# Altium footprint library PRL_PDC.PcbLib: 77 footprints (part 5 of 5)
Each footprint in its own frame and in the unit in brackets; x right, y up, seen from the top. Pads: shape width x height; smd on the part's side, far side on the other; paste and mask are expansions set on the pad; w line width, h text height; cw(c..) or ccw(c..) is an arc to the next point about the centre after c.
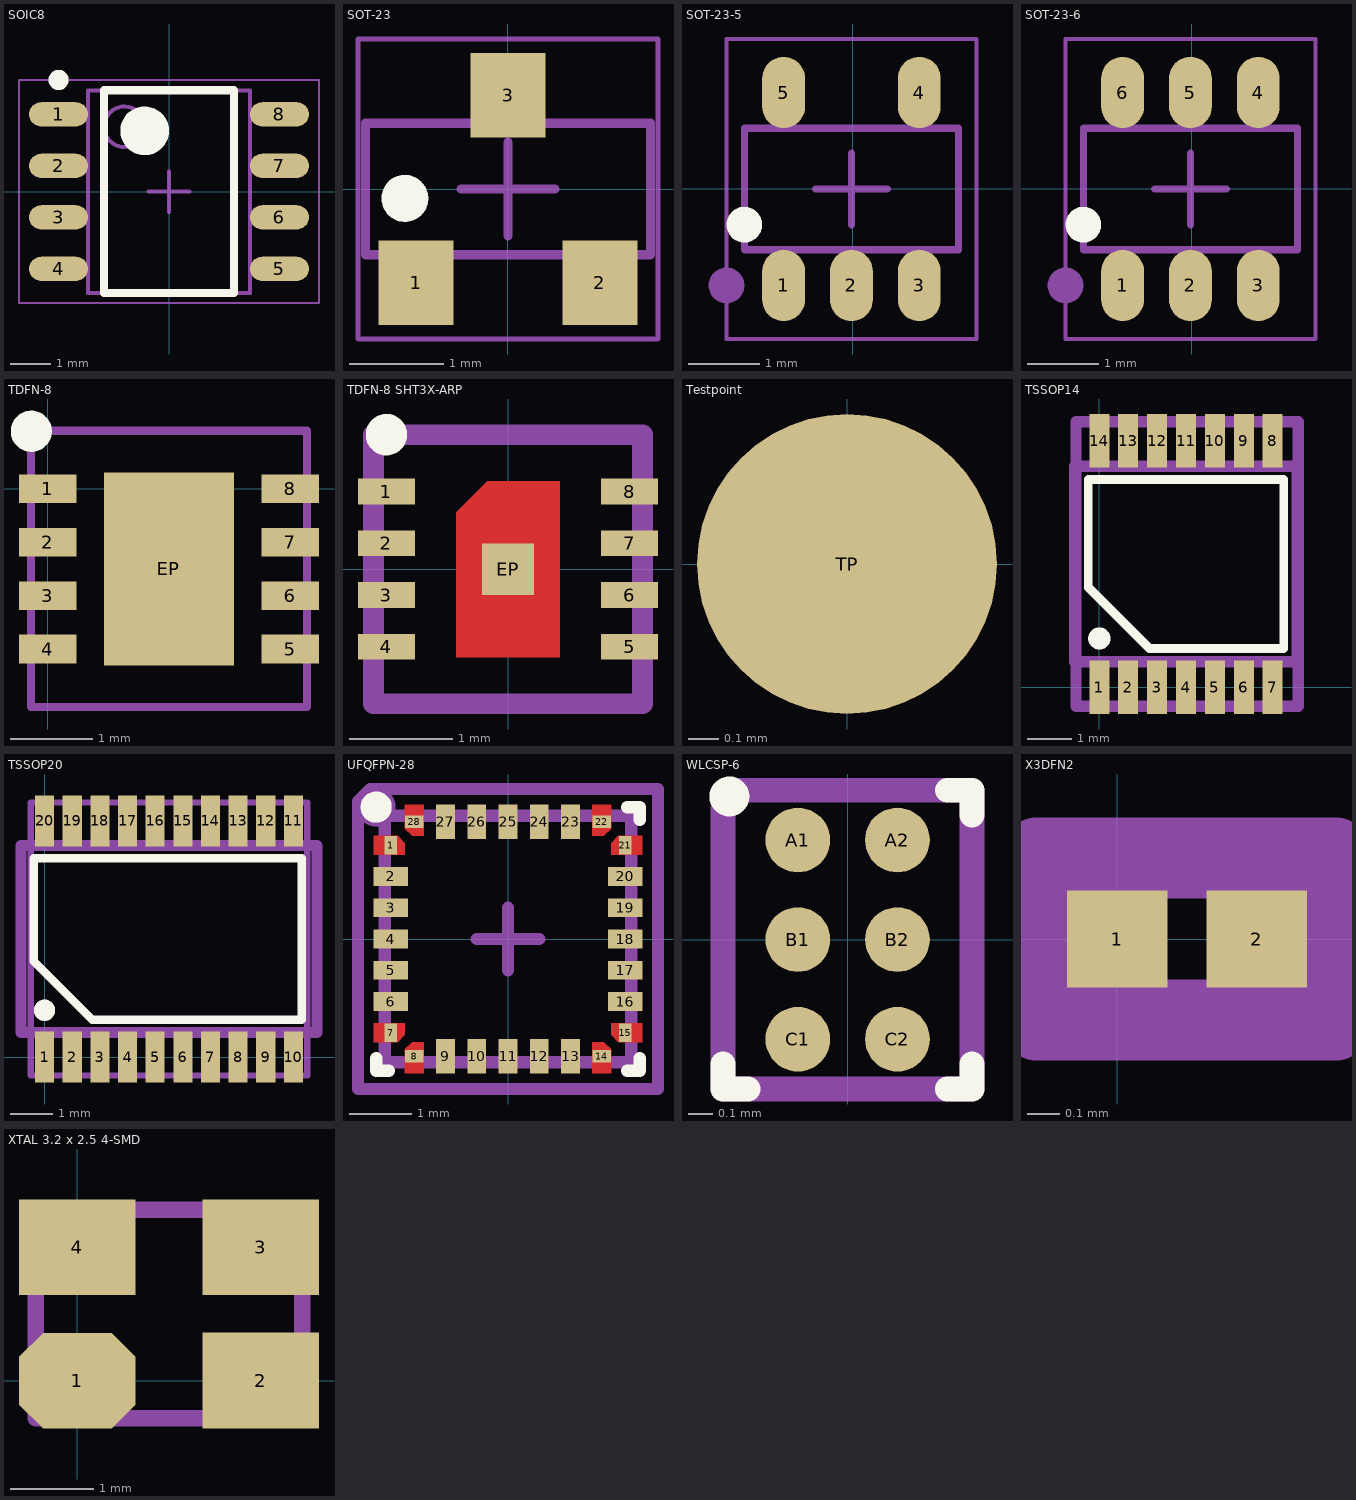
[diagram p4: the footprints below, top view; thin cyan lines are the x and y axes]

## SOIC8 [mm] "SOIC, 8-Leads, Body 4,90x3,90mm, Pitch 1,27mm, IPC Medium Density"
height 1.75
pads (8):
  oval 1.45x0.6 smd: 1(-2.725,1.905) 2(-2.725,0.635) 3(-2.725,-0.635) 4(-2.725,-1.905) 5(2.725,-1.905) 6(2.725,-0.635) 7(2.725,0.635) 8(2.725,1.905)
Top Overlay:
  circle w0.25: c-2.725,2.755 r0.125
  circle w0.6: c-0.6,1.5 r0.3
  lines w0.2: -1.6,-2.5 -1.6,2.5 1.6,2.5 1.6,-2.5 -1.6,-2.5
Mechanical 13:
  circle w0.1: c-1.1,1.6 r0.5
  lines w0.1: -2,-2.5 -2,2.5 2,2.5 2,-2.5 -2,-2.5
Mechanical 15:
  lines w0.05: -3.7,-2.75 -3.7,2.75 3.7,2.75 3.7,-2.75 -3.7,-2.75
  lines w0.1: -0.5,0 0.5,0 ; 0,-0.5 0,0.5
3D body "SOIC127P600X175-8N.step": height 1.75, standoff 0, extent -3,-2.5 3,2.5

## SOT-23 [mm]
height 1.1
pads (3):
  rect 0.8x0.9 smd: 1(-0.98,-1) 2(0.98,-1) 3(0,1)
Top Overlay:
  circle w0.25: c-1.1,-0.1 r0.125
Mechanical 13:
  lines w0.1: -1.52,-0.7 -1.52,0.7 1.52,0.7 1.52,-0.7 -1.52,-0.7
Mechanical 15:
  lines w0.05: -1.6,-1.6 -1.6,1.6 1.6,1.6 1.6,-1.6 -1.6,-1.6
  lines w0.1: -0.5,0 0.5,0 ; 0,-0.5 0,0.5
3D body "User Library-sot23-1.step": height 1, standoff 0, extent -1.46,-1.17 1.46,1.17

## SOT-23-5 [mm]
height 1.1
pads (5):
  oval 0.6x1 smd: 1(-0.966,-1.35) 2(-0.016,-1.35) 3(0.934,-1.35) 4(0.934,1.35) 5(-0.966,1.35)
Top Overlay:
  circle w0.25: c-1.516,-0.5 r0.125
Mechanical 1:
  circle w0.25: c-1.766,-1.35 r0.125
Mechanical 13:
  lines w0.1: -1.516,-0.85 1.484,-0.85 1.484,0.85 -1.516,0.85 -1.516,-0.85
Mechanical 15:
  lines w0.05: -1.766,-2.1 -1.766,2.1 1.734,2.1 1.734,-2.1 -1.766,-2.1
  lines w0.1: -0.516,0 0.484,0 ; -0.016,-0.5 -0.016,0.5
3D body "User Library-SOT-23-5.STEP": height 1.5, standoff 0.04, extent -1.516,-1.5 1.484,1.5

## SOT-23-6 [mm]
height 1.1
pads (6):
  oval 0.6x1 smd: 1(-0.966,-1.35) 2(-0.016,-1.35) 3(0.934,-1.35) 4(0.934,1.35) 5(-0.016,1.35) 6(-0.966,1.35)
Top Overlay:
  circle w0.25: c-1.516,-0.5 r0.125
Mechanical 1:
  circle w0.25: c-1.766,-1.35 r0.125
Mechanical 13:
  lines w0.1: -1.516,-0.85 -1.516,0.85 1.484,0.85 1.484,-0.85 -1.516,-0.85
Mechanical 15:
  lines w0.05: -1.766,-2.1 1.734,-2.1 1.734,2.1 -1.766,2.1 -1.766,-2.1
  lines w0.1: -0.516,0 0.484,0 ; -0.016,-0.5 -0.016,0.5
3D body "TSOP95P280X145-6N.step": height 1.45, standoff 0, extent -1.516,-1.4 1.484,1.4

## TDFN-8 [mm] "TDFN-8"
height 1
pads (9):
  rect 0.7x0.35 smd paste-0.1: 1(0,0) 2(0,-0.65) 3(0,-1.3) 4(0,-1.95) 5(2.95,-1.95) 6(2.95,-1.3) 7(2.95,-0.65) 8(2.95,0)
  rect 1.58x2.35 smd paste-0.1: EP(1.475,-0.975)
Top Overlay:
  circle w0.25: c-0.2,0.7 r0.125
Mechanical 1:
  lines w0.1: -0.205,-2.655 3.155,-2.655 3.155,0.705 -0.205,0.705 -0.205,-2.655
3D body "User Library-TDFN-8-EP_3x3mm.step": height 1, standoff 0, extent -0.205,-2.655 3.155,0.705

## TDFN-8 SHT3X-ARP [mm] "TDFN-8"
height 1
pads (9):
  rect 0.55x0.25 smd paste-0.1: 1(-1.175,0.75) 2(-1.175,0.25) 3(-1.175,-0.25) 4(-1.175,-0.75) 5(1.175,-0.75) 6(1.175,-0.25) 7(1.175,0.25) 8(1.175,0.75)
  rect 0.5x0.5 smd: EP(0,0)
Top Layer:
  region: -0.2,0.85 0.5,0.85 0.5,-0.85 -0.5,-0.85 -0.5,0.55
Top Overlay:
  circle w0.2: c-1.175,1.3 r0.1
Mechanical 1:
  lines w0.1: -1.251,-1.251 1.251,-1.251 1.251,1.251 -1.251,1.251 -1.251,-1.251
Mechanical 15:
  lines w0.2: -1.3,-1.3 1.3,-1.3 1.3,1.3 -1.3,1.3 -1.3,-1.3
3D body "Sensirion_Humidity_SHT3x_STEP-file.STEP": height 0.95, standoff 0.05, extent -1.251,-1.251 1.251,1.251

## Testpoint [mm]
pads (1):
  round 1 smd paste-0.1: TP(0,0)

## TSSOP14 [mm] "14-Lead Plastic TSSOP (4.4mm)"
height 2
pads (14):
  rect 0.45x1.2 smd: 1(0,0) 2(0.65,0) 3(1.3,0) 4(1.95,0) 5(2.6,0) 6(3.25,0) 7(3.9,0) 8(3.9,5.55) 9(3.25,5.55) 10(2.6,5.55) 11(1.95,5.55) 12(1.3,5.55) 13(0.65,5.55) 14(0,5.55)
Top Overlay:
  circle w0.3: c0,1.1 r0.1
  lines w0.2: -0.25,2.25 1.125,0.875 4.15,0.875 4.15,4.675 -0.25,4.675 -0.25,2.25
Mechanical 1:
  lines w0.254: -0.527,5.9 -0.451,5.976 4.473,5.976 4.473,-0.426 -0.527,-0.426 -0.527,5.976
Mechanical 15:
  lines w0.1: -0.15,0.575 -0.15,-0.425 0.15,-0.425 0.15,0.575 ; -0.15,4.975 -0.15,5.975 0.15,5.975 0.15,4.975 ; 0.5,0.575 0.5,-0.425 0.8,-0.425 0.8,0.575 ; 0.5,4.975 0.5,5.975 0.8,5.975 0.8,4.975 ; 1.15,0.575 1.15,-0.425 1.45,-0.425 1.45,0.575 ; 1.15,4.975 1.15,5.975 1.45,5.975 1.45,4.975 ; 1.8,0.575 1.8,-0.425 2.1,-0.425 2.1,0.575 ; 1.8,4.975 1.8,5.975 2.1,5.975 2.1,4.975 ; 2.45,0.575 2.45,-0.425 2.75,-0.425 2.75,0.575 ; 2.45,4.975 2.45,5.975 2.75,5.975 2.75,4.975 ; 3.1,0.575 3.1,-0.425 3.4,-0.425 3.4,0.575 ; 3.1,4.975 3.1,5.975 3.4,5.975 3.4,4.975 ; 3.75,0.575 3.75,-0.425 4.05,-0.425 4.05,0.575 ; 3.75,4.975 3.75,5.975 4.05,5.975 4.05,4.975
  lines w0.254: -0.55,0.575 -0.55,4.975 4.45,4.975 4.45,0.575 -0.55,0.575
3D body "tssop_14.step": height 1.26, standoff 0.04, extent -0.489,-0.426 4.511,5.976

## TSSOP20 [mm] "20-Lead Plastic TSSOP (6.5mm)"
height 2
pads (20):
  rect 0.45x1.2 smd: 1(0,0) 2(0.65,0) 3(1.3,0) 4(1.95,0) 5(2.6,0) 6(3.25,0) 7(3.9,0) 8(4.55,0) 9(5.2,0) 10(5.85,0) 11(5.85,5.55) 12(5.2,5.55) 13(4.55,5.55) 14(3.9,5.55) 15(3.25,5.55) 16(2.6,5.55) 17(1.95,5.55) 18(1.3,5.55) 19(0.65,5.55) 20(0,5.55)
Top Overlay:
  circle w0.3: c0,1.1 r0.1
  lines w0.2: -0.25,2.25 1.125,0.875 6.05,0.875 6.05,4.675 -0.25,4.675 -0.25,2.25
Mechanical 1:
  lines w0.15: -0.325,-0.433 -0.325,5.983 6.175,5.983 6.175,-0.433 -0.325,-0.433
Mechanical 15:
  circle w0.3: c0,1.1 r0.1
  lines w0.1: -0.15,0.575 -0.15,-0.425 0.15,-0.425 0.15,0.575 ; -0.15,4.975 -0.15,5.975 0.15,5.975 0.15,4.975 ; 0.5,0.575 0.5,-0.425 0.8,-0.425 0.8,0.575 ; 0.5,4.975 0.5,5.975 0.8,5.975 0.8,4.975 ; 1.15,0.575 1.15,-0.425 1.45,-0.425 1.45,0.575 ; 1.15,4.975 1.15,5.975 1.45,5.975 1.45,4.975 ; 1.8,0.575 1.8,-0.425 2.1,-0.425 2.1,0.575 ; 1.8,4.975 1.8,5.975 2.1,5.975 2.1,4.975 ; 2.45,0.575 2.45,-0.425 2.75,-0.425 2.75,0.575 ; 2.45,4.975 2.45,5.975 2.75,5.975 2.75,4.975 ; 3.1,0.575 3.1,-0.425 3.4,-0.425 3.4,0.575 ; 3.1,4.975 3.1,5.975 3.4,5.975 3.4,4.975 ; 3.75,0.575 3.75,-0.425 4.05,-0.425 4.05,0.575 ; 4.4,0.575 4.4,-0.425 4.7,-0.425 4.7,0.575 ; 4.4,4.975 4.4,5.975 4.7,5.975 4.7,4.975 ; 5.05,0.575 5.05,-0.425 5.35,-0.425 5.35,0.575 ; 5.05,4.975 5.05,5.975 5.35,5.975 5.35,4.975 ; 5.7,0.575 5.7,-0.425 6,-0.425 6,0.575 ; 5.7,4.975 5.7,5.975 6,5.975 6,4.975 ; 3.75,5.975 3.75,4.975 3.75,5.975 ; 3.75,5.975 4.05,5.975 ; 3.75,5.975 4.05,5.975 ; 4.05,5.975 4.05,4.975 4.05,5.975
  lines w0.254: -0.55,0.575 -0.55,4.975 6.4,4.975 6.4,0.575 -0.55,0.575
3D body "TSSOP-20.stp": height 1.3, standoff -0.02, extent -0.325,-0.433 6.175,5.983

## UFQFPN-28 [mm] "UFQFPN-28 4X4 BODY"
height 1
pads (28):
  rect 0.2x0.3 smd paste+0 mask+0: 1(-1.875,1.5) 15(1.875,-1.5)
  rect 0.55x0.3 smd: 2(-1.875,1) 3(-1.875,0.5) 4(-1.875,0) 5(-1.875,-0.5) 6(-1.875,-1) 16(1.875,-1) 17(1.875,-0.5) 18(1.875,0) 19(1.875,0.5) 20(1.875,1)
  rect 0.2x0.3 smd mask+0: 7(-1.875,-1.5) 21(1.875,1.5)
  rect 0.3x0.2 smd paste+0 mask+0: 8(-1.5,-1.875) 22(1.5,1.875)
  rect 0.3x0.55 smd: 9(-1,-1.875) 10(-0.5,-1.875) 11(0,-1.875) 12(0.5,-1.875) 13(1,-1.875) 23(1,1.875) 24(0.5,1.875) 25(0,1.875) 26(-0.5,1.875) 27(-1,1.875)
  rect 0.3x0.2 smd mask+0: 14(1.5,-1.875) 28(-1.5,1.875)
Top Layer:
  region: -1.35,-1.65 -1.535,-1.65 -1.65,-1.765 -1.65,-2.15 -1.35,-2.15
  region: 1.35,-1.65 1.535,-1.65 1.65,-1.765 1.65,-2.15 1.35,-2.15
  region: -1.65,-1.35 -1.65,-1.535 -1.765,-1.65 -2.15,-1.65 -2.15,-1.35
  region: -1.65,1.35 -1.65,1.535 -1.765,1.65 -2.15,1.65 -2.15,1.35
  region: 1.65,-1.35 1.65,-1.535 1.765,-1.65 2.15,-1.65 2.15,-1.35
  region: 1.65,1.35 1.65,1.535 1.765,1.65 2.15,1.65 2.15,1.35
  region: -1.35,1.65 -1.535,1.65 -1.65,1.765 -1.65,2.15 -1.35,2.15
  region: 1.35,1.65 1.535,1.65 1.65,1.765 1.65,2.15 1.35,2.15
Top Overlay:
  circle w0.25: c-2.11,2.11 r0.125
  lines w0.2: -2.11,-1.91 -2.11,-2.11 -1.91,-2.11 ; 1.91,-2.11 2.11,-2.11 2.11,-1.91 ; 1.91,2.11 2.11,2.11 2.11,1.91
Mechanical 13:
  circle w0.3: c-2.11,2.11 r0.162
  lines w0.2: -1.975,-1.975 1.975,-1.975 1.975,1.975 -1.975,1.975 -1.975,-1.975
Mechanical 15:
  lines w0.2: -0.5,0 0.5,0 ; 0,-0.5 0,0.5 ; -2.4,-2.4 -2.4,2.2 -2.2,2.4 2.4,2.4 2.4,-2.4 -2.4,-2.4
3D body "UFQFPN28.step": height 0.57, standoff -0.01, extent -2.01,-2.01 2.01,2.01

## WLCSP-6 [mm] "6-Ball Wafer Level Chip Scale Package 1.00 mm × 1.20 mm Body"
height 1
pads (6):
  round 0.26 smd mask+0: A1(-0.2,0.4) A2(0.2,0.4) B1(-0.2,0) B2(0.2,0) C1(-0.2,-0.4) C2(0.2,-0.4)
Top Overlay:
  circle w0.1: c-0.475,0.575 r0.03
  lines w0.1: -0.5,-0.5 -0.5,-0.6 -0.4,-0.6 ; 0.4,-0.6 0.5,-0.6 0.5,-0.5 ; 0.4,0.6 0.5,0.6 0.5,0.5
Mechanical 1:
  lines w0.1: -0.5,-0.6 0.5,-0.6 0.5,0.6 -0.428,0.6 -0.5,0.528 -0.5,-0.6
3D body: height 0.23, standoff -0.03, extent 0.078,-0.528 0.33,-0.272
3D body: height 0.23, standoff -0.03, extent -0.322,-0.528 -0.07,-0.272
3D body: height 0.23, standoff -0.03, extent -0.322,-0.128 -0.07,0.128
3D body: height 0.23, standoff -0.03, extent 0.082,-0.128 0.334,0.128
3D body: height 0.23, standoff -0.03, extent 0.078,0.272 0.33,0.528
3D body: height 0.23, standoff -0.03, extent -0.322,0.272 -0.07,0.528
3D body: height 0.56, standoff 0.2, extent -0.5,-0.6 0.5,0.6
3D body: height 0.57, standoff 0.33, extent -0.439,0.439 -0.339,0.539

## X3DFN2 [mm] "0.62x0.32, 0.355P, (0201)"
height 0.5
pads (2):
  rect 0.31x0.3 smd paste+0 mask+0: 1(0,0) 2(0.43,0)
Mechanical 7:
  lines w0.2: -0.25,-0.275 0.675,-0.275 0.675,0.275 -0.25,0.275 -0.25,-0.275
Mechanical 13:
  lines w0.1: -0.11,-0.175 0.54,-0.175 0.54,0.175 -0.11,0.175 -0.11,-0.175
3D body: height 0.33, standoff 0.01, extent -0.11,-0.175 0.54,0.175

## XTAL 3.2 x 2.5 4-SMD [mm] "3.20mm x 2.50mm Crystal 4-SMD NO LEAD"
pads (4):
  oct 1.4x1.15 smd paste-0.1: 1(0,0)
  rect 1.4x1.15 smd paste-0.1: 2(2.2,0) 3(2.2,1.6) 4(0,1.6)
Mechanical 1:
  lines w0.2: -0.5,-0.45 2.7,-0.45 2.7,2.05 -0.5,2.05 -0.5,-0.45
3D body "3.2mm x 2.5mm SMD crystal.step": height 0.55, standoff 0, extent -0.5,-0.45 2.7,2.05